# Altium schematic symbol library Electronic Devices_LIB.SchLib: 703 symbols (part 8 of 8)
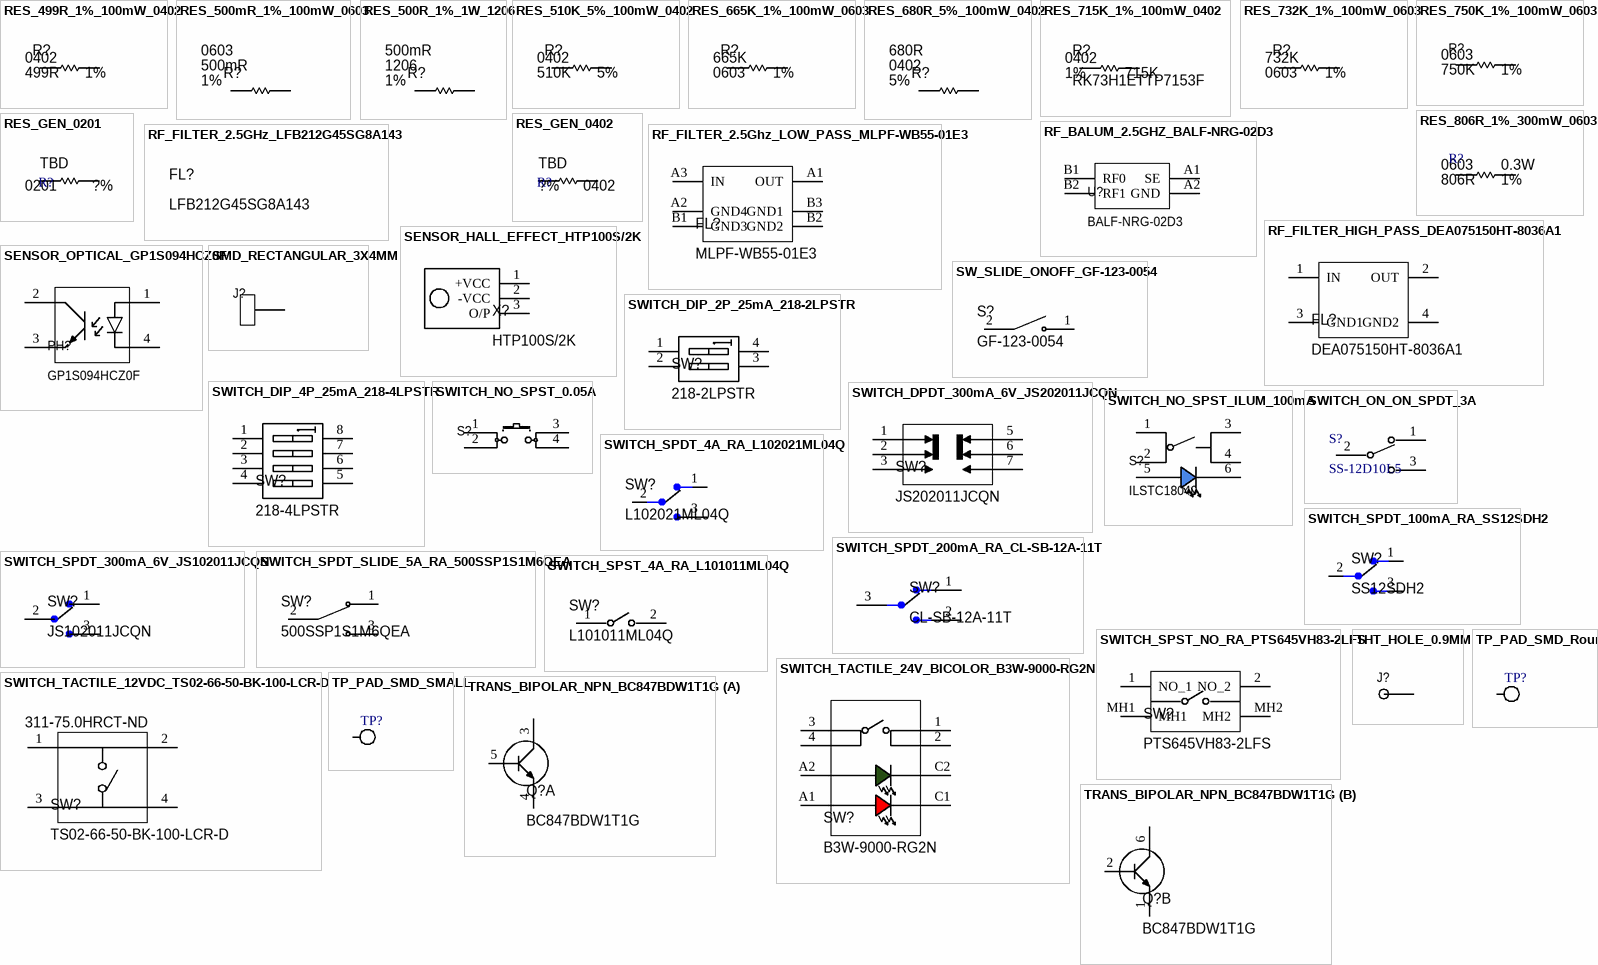
[diagram p43: symbols RES_499R_1%_100mW_0402 to TRANS_BIPOLAR_NPN_BC847BDW1T1G]

## RF_BALUM_2.5GHZ_BALF-NRG-02D3
designator U?, comment BALF-NRG-02D3
50 ohm nominal input / conjugate match to BlueNRG tranceiver, with integrated harmonic filter; Manufacturer: STMicroelectronics; Supplier 1: Digi-Key; Manufacturer Part Number: BALF-NRG-02D3; RoHS: Yes; Category: EMI / RFI Components; Stock 1: 10367; Pricing 1: 1=0.53, 10=0.517, 25=0.3464, 50=0.3082, 100=0.2824, 250=0.2534, 500=0.2481, 1000=0.17948 (USD); Mount: Surface Mount; Packaging: Cut Tape; Series: -; RoHS Compliant: Yes; ComponentLink1URL: http://www.farnell.com/datasheets/2342732.pdf?src-supplier=Farnell; ComponentLink1Description: http://www.farnell.com/datasheets/2342732.pdf?src-supplier=Farnell; ComponentLink2URL: http://www.st.com/content/ccc/resource/technical/document/datasheet/group3/51/4f/c4/19/79/13/4a/ad/DM00408204/files/DM00408204.pdf/jcr:content/translations/en.DM00408204.pdf?src-supplier=Digi-Key; ComponentLink2Description: http://www.st.com/content/ccc/resource/technical/document/datasheet/group3/51/4f/c4/19/79/13/4a/ad/DM00408204/files/DM00408204.pdf/jcr:content/translations/en.DM00408204.pdf?src-supplier=Digi-Key; ComponentLink3URL: http://www.farnell.com/datasheets/2342732.pdf?src-supplier=Element14; ComponentLink3Description: http://www.farnell.com/datasheets/2342732.pdf?src-supplier=Element14; ComponentLink4URL: https://datasheet.octopart.com/BALF-NRG-02D3-STMicroelectronics-datasheet-93404502.pdf?src-supplier=Newark; ComponentLink4Description: https://datasheet.octopart.com/BALF-NRG-02D3-STMicroelectronics-datasheet-93404502.pdf?src-supplier=Newark; ComponentLink5URL: http://www.farnell.com/datasheets/2342732.pdf?src-supplier=Newark; ComponentLink5Description: http://www.farnell.com/datasheets/2342732.pdf?src-supplier=Newark; Supplier Part Number 1: 497-17591-1-ND
footprint RF_BALUN_BALFNRG02D3 (4-UFBGA, CSPBGA)
pins: A1 SE, A2 GND, B1 RF0, B2 RF1

## RF_FILTER_2.5GHz_LFB212G45SG8A143
designator FL?, comment LFB212G45SG8A143
RF Filter Band Pass 2450MHz Frequency 50MHz 2.9dB 50Ohm SMD 4Pin 0805 Embossed T/R; Manufacturer: Murata; Impedance: 50R; Frequency: 2.45GHz; Supplier 1: Digikey; Manufacturer Part Number: LFB212G45SG8A143; RoHS: Yes; Category: EMI / RFI Components; Pricing 1: 4000=0.10415 (USD); Number of Pins: 4; Min Operating Temperature: -40°C; Max Operating Temperature: 85°C; Package Quantity: 4000; Packaging: Tape and Reel; Resistance: 50R; Series: LFB; Length: 2mm; Width: 1.25mm; Radiation Hardening: No; RoHS Compliant: Yes; ComponentLink1URL: http://www.mouser.com/ds/2/281/k99e_l0270-1112974.pdf?src-supplier=Mouser; ComponentLink1Description: http://www.mouser.com/ds/2/281/k99e_l0270-1112974.pdf?src-supplier=Mouser; ComponentLink2URL: http://search.murata.co.jp/Ceramy/CatalogAction.do?sHinnm=?&nbsp&sNHinnm=LFB212G45SG8A143&sNhin_key=LFB212G45SG8A143&sLang=en&sParam=series+U0060L0270S0260A051&src-supplier=Avnet; ComponentLink2Description: http://search.murata.co.jp/Ceramy/CatalogAction.do?sHinnm=?&nbsp&sNHinnm=LFB212G45SG8A143&sNhin_key=LFB212G45SG8A143&sLang=en&sParam=series+U0060L0270S0260A051&src-supplier=Avnet; Supplier Part Number 1: LFB212G45SG8A143-ND

## RF_FILTER_2.5Ghz_LOW_PASS_MLPF-WB55-01E3
designator FL?, comment MLPF-WB55-01E3
Rf Filter, 2.4Ghz To 2.5Ghz, Wlcsp-6 Rohs Compliant: Yes |Stmicroelectronics MLPF-WB55-01E3; Frequency: 2.45GHz; Bandwidth: 100MHz; Insertion Loss: 1.1dB; Supplier 1: Digi-Key; Manufacturer: STMicroelectronics; Manufacturer Part Number: MLPF-WB55-01E3; RoHS: Yes; Category: EMI / RFI Components; Stock 1: 23961; Pricing 1: 1=0.4, 10=0.38, 25=0.368, 50=0.3558, 100=0.3373, 250=0.28212, 500=0.21896, 1000=0.20853 (USD); Mount: Surface Mount; Case/Package: SMD/SMT; Series: -; Packaging: Cut Tape; ComponentLink1URL: http://www.farnell.com/datasheets/2802556.pdf?src-supplier=Farnell; ComponentLink1Description: http://www.farnell.com/datasheets/2802556.pdf?src-supplier=Farnell; ComponentLink2URL: http://www.farnell.com/datasheets/2802556.pdf?src-supplier=Newark; ComponentLink2Description: http://www.farnell.com/datasheets/2802556.pdf?src-supplier=Newark; Supplier Part Number 1: 497-19088-1-ND
footprint RF_FILTER_STMicroelectronics_0_MFG (CSP package)
pins: A1 OUT, A2 GND4 (power), A3 IN (power), B1 GND3 (power), B2 GND2 (power), B3 GND1 (power)

## RF_FILTER_HIGH_PASS_DEA075150HT-8036A1
designator FL?, comment DEA075150HT-8036A1
RF Filter High Pass 5150MHz 2400MHz to 2500MHz 0.5dB 50Ohm SMD 4Pin 0202 T/R; Manufacturer: TDK; Frequency: 5GHz; Supplier 1: Digikey; Manufacturer Part Number: DEA075150HT-8036A1; RoHS: No; Stock 1: 5961; Pricing 1: 1=0.24, 10=0.23, 25=0.2228, 50=0.2154, 100=0.2042, 250=0.1708, 500=0.13256, 1000=0.12625, 5000=0.11139 (USD); Mount: Surface Mount; Case Code (Imperial): 0202; Case Code (Metric): 0505; Packaging: Cut Tape; Insertion Loss: 0.5dB; Series: DEA; ComponentLink1URL: https://media.digikey.com/pdf/Data%20Sheets/TDK%20PDFs/DEA075150HT-8036A1_Rev1.0.pdf?src-supplier=Digikey; ComponentLink1Description: https://media.digikey.com/pdf/Data%20Sheets/TDK%20PDFs/DEA075150HT-8036A1_Rev1.0.pdf?src-supplier=Digikey; Supplier Part Number 1: 445-175384-1-ND
footprint RF_FILTER_HP_DEA075150HT8036A1
pins: 1 IN, 2 OUT, 3 GND1, 4 GND2

## SENSOR_HALL_EFFECT_HTP100S/2K
designator X?, comment HTP100S/2K
The HTP100/2K is a closed loop Hall Effect Current Transformer suitable for measuring currents up to 100A; Manufacturer: Telcom; Manufacturer Part Number: HTP100S/2K
footprint SENSOR_HALL_EFFECT_HTP100S/2K
pins: 1 +VCC, 2 -VCC, 3 O/P

## SENSOR_OPTICAL_GP1S094HCZ0F
designator PH?, comment GP1S094HCZ0F
Photointerrupter Transmissive 3mm Phototransistor 4-Pin SubMiniature Wide-gap; Manufacturer: Sharp; Reverse Breakdown Voltage: 6V; Forward Current: 50mA; Rise Time: 150000ns; Number of Channels: 1; Forward Voltage: 1.2V; Sensing Distance: 0.118inch; Max Collector Current: 20mA; Collector Emitter Voltage (VCEO): 35V; Response Time: 50us; Power Dissipation: 100mW; Supplier 1: Mouser; Manufacturer Part Number: GP1S094HCZ0F; RoHS: Yes; Category: Optical Sensors; Stock 1: 25133; Pricing 1: 1=0.76, 10=0.485, 50=0.485, 100=0.413, 500=0.359, 1000=0.314, 2500=0.307, 5000=0.278, 10000=0.266, 25000=0.263 (USD); Mount: Through Hole; Number of Pins: 4; Contact Plating: Copper,Tin; Min Operating Temperature: -25°C; Max Operating Temperature: 85°C; Packaging: Rail/Tube; Package Quantity: 5000; Fall Time: 150000ns; Number of Elements: 1; Reverse Voltage (DC): 6V; Collector Emitter Breakdown Voltage: 35V; Input Current: 20mA; Output Current: 20mA; Output Configuration: Phototransistor; Collector-emitter Voltage-Max: 35V; Output Voltage: 35V; Max Power Dissipation: 100mW; Output Type: Phototransistor; Series: -; Length: 5.5mm; Width: 2.6mm; Height: 4.8mm; Radiation Hardening: No; Lead Free: Lead Free; RoHS Compliant: Yes; Reach SVHC Compliant: Unknown; ComponentLink1URL: https://datasheet.ciiva.com/11772/0900766b80d1bdb9-11772555.pdf?src-supplier=Rs; ComponentLink1Description: https://datasheet.ciiva.com/11772/0900766b80d1bdb9-11772555.pdf?src-supplier=Rs; ComponentLink2URL: https://datasheet.ciiva.com/4423/gp1s094hcz0f-ds-181193-4423979.pdf?src-supplier=Mouser; ComponentLink2Description: https://datasheet.ciiva.com/4423/gp1s094hcz0f-ds-181193-4423979.pdf?src-supplier=Mouser; ComponentLink3URL: https://datasheet.ciiva.com/2822/gp1s094hcz0f-ds-2822986.pdf?src-supplier=Digi-Key; ComponentLink3Description: https://datasheet.ciiva.com/2822/gp1s094hcz0f-ds-2822986.pdf?src-supplier=Digi-Key; ComponentLink4URL: https://datasheet.ciiva.com/26812/getdatasheetpartid-172569-26812270.pdf?src-supplier=Verical; ComponentLink4Description: https://datasheet.ciiva.com/26812/getdatasheetpartid-172569-26812270.pdf?src-supplier=Verical; ComponentLink5URL: https://datasheet.ciiva.com/16392/gp1s094hcz-e-16392162.pdf?src-supplier=Future+Electronics; ComponentLink5Description: https://datasheet.ciiva.com/16392/gp1s094hcz-e-16392162.pdf?src-supplier=Future+Electronics; ComponentLink6URL: https://datasheet.ciiva.com/7663/gp1s094hcz-e-7663226.pdf?src-supplier=Element14; ComponentLink6Description: https://datasheet.ciiva.com/7663/gp1s094hcz-e-7663226.pdf?src-supplier=Element14; Supplier Part Number 1: 852-GP1S094HCZ0F
footprint SENSOR_OPTICAL_GP1S094HCZ0F (Through Hole, 4.55 pitch)
pins: 1 ANODE, 2 COLLECTOR, 3 EMITTER, 4 CATHODE

## SMD_RECTANGULAR_3X4MM
designator J?, comment SMD_RECTANGULAR_2X3MM  (value not drawn)
Rectangular Pad 2x3mm to connect wires on PCB
footprint SMD_RECTANGULAR (3X4 MM PAD RECTANGULAR)
pins: 1

## SW_SLIDE_ONOFF_GF-123-0054
designator S?, comment GF-123-0054
Slide Switch, Mini, G Series, SPST, ON-OFF, Top Actuated, 0.5A, 125VDC, 8.5A, 125V, PC; Manufacturer: CW Industries; Mechanical Life: 10000Cycles; Actuator Material: Nylon,Polyamide,PA66; Electrical Life: 6000Cycles; Switch Travel: 3.61mm; Actuator Type: Standard; Actuator Length: 5.08mm; Supplier 1: Digikey; Manufacturer Part Number: GF-123-0054; RoHS: Yes; Category: Slide Switches; Stock 1: 1504; Pricing 1: 1=1.5, 10=1.439, 500=0.9902, 1000=0.92112, 5000=0.7772, 10000=0.71963 (USD); Mount: Through Hole; Contact Material: Copper; Contact Plating: Silver; Min Operating Temperature: -10°C; Max Operating Temperature: 104°C; Package Quantity: 500; Packaging: Bulk; Voltage Rating (AC): 125V; Voltage Rating (DC): 125V; Termination: PC Pin; Throw Configuration: SPST; Switch Function: On-Off; Series: GF; RoHS Compliant: Yes; ComponentLink1URL: https://datasheet.ciiva.com/25648/gf-123-dimension-drawing-25648859.pdf?src-supplier=Digikey; ComponentLink1Description: https://datasheet.ciiva.com/25648/gf-123-dimension-drawing-25648859.pdf?src-supplier=Digikey; ComponentLink2URL: https://datasheet.ciiva.com/18517/gfxx23andxx24-18517237.pdf?src-supplier=Digikey; ComponentLink2Description: https://datasheet.ciiva.com/18517/gfxx23andxx24-18517237.pdf?src-supplier=Digikey; Supplier Part Number 1: CWI333-ND
footprint SW_SLIDE_GF-123-0054 (3.61mm)
pins: 1, 2

## SWITCH_DIP_2P_25mA_218-2LPSTR
designator SW?, comment 218-2LPSTR
Switch DIP ON OFF SPST 2 Recessed Slide 0.025A 24VDC Gull Wing 1000Cycles 1.27mm SMD T/R; Manufacturer: CTS; Voltage Rating (DC): 24V; Current Rating: 25mA; Number of Positions: 2; Actuator Type: Slide (Standard); Pitch: 0.05inch; Washable: Yes; Supplier 1: Digi-Key; Manufacturer Part Number: 218-2LPSTR; RoHS: Yes; Category: DIP Switches; Stock 1: 31125; Pricing 1: 1=0.97, 10=0.93, 25=0.8692, 100=0.7548, 250=0.6868, 500=0.6367, 1000=0.59021 (USD); Mount: Surface Mount; Contact Material: Copper; Contact Plating: Gold; Min Operating Temperature: -55°C; Max Operating Temperature: 85°C; Packaging: Tape and Reel; Throw Configuration: SPST; Termination: Gull Wing; Electrical Life: 1000Cycles; Series: 218; Package Quantity: 2000; Max Current Rating: 25mA; Orientation: Straight; Length: 0.146inch; Depth: 8.44mm; Radiation Hardening: No; Lead Free: Lead Free; RoHS Compliant: Yes; ComponentLink1URL: https://datasheet.ciiva.com/2865/218-2865152.pdf?src-supplier=Digi-Key; ComponentLink1Description: https://datasheet.ciiva.com/2865/218-2865152.pdf?src-supplier=Digi-Key; ComponentLink2URL: https://datasheet.ciiva.com/29890/218-29890939.pdf?src-supplier=Avnet; ComponentLink2Description: https://datasheet.ciiva.com/29890/218-29890939.pdf?src-supplier=Avnet; ComponentLink3URL: https://datasheet.ciiva.com/15184/getdatasheetpartid-224320-15184939.pdf?src-supplier=Verical; ComponentLink3Description: https://datasheet.ciiva.com/15184/getdatasheetpartid-224320-15184939.pdf?src-supplier=Verical; Supplier Part Number 1: CT3108CT-ND
footprint SW_DIP_2P_2182LPSTR (0.050" (1.27mm), Half)
pins: 1 A1, 2 A2, 3 B2, 4 B1

## SWITCH_DIP_4P_25mA_218-4LPSTR
designator SW?, comment 218-4LPSTR
Switch DIP ON OFF SPST 4 Recessed Slide 0.025A 24VDC Gull Wing 1000Cycles 1.27mm SMD T/R; Manufacturer: CTS; Number of Positions: 4; Voltage Rating (DC): 24V; Actuator Type: Slide (Standard); Max Current Rating: 25mA; Washable: Yes; Supplier 1: Digi-Key; Manufacturer Part Number: 218-4LPSTR; RoHS: Yes; Category: DIP Switches; Stock 1: 12605; Pricing 1: 1=1.08, 10=1.041, 25=0.978, 100=0.8449, 250=0.76996, 500=0.71586, 1000=0.66592 (USD); Mount: Surface Mount; Contact Material: Copper; Contact Plating: Gold; Mechanical Life: 1000Cycles; Min Operating Temperature: -55°C; Max Operating Temperature: 85°C; Throw Configuration: SPST; Packaging: Tape and Reel; Electrical Life: 1000Cycles; Series: 218; Max Voltage Rating (DC): 24V; Termination: Gull Wing; Orientation: Straight; Package Quantity: 2000; Length: 6.25mm; Depth: 8.44mm; Radiation Hardening: No; Lead Free: Lead Free; RoHS Compliant: Yes; ComponentLink1URL: https://datasheet.ciiva.com/8676/218-8676896.pdf?src-supplier=Avnet; ComponentLink1Description: https://datasheet.ciiva.com/8676/218-8676896.pdf?src-supplier=Avnet; ComponentLink2URL: https://datasheet.ciiva.com/8082/218-8082342.pdf?src-supplier=Avnet; ComponentLink2Description: https://datasheet.ciiva.com/8082/218-8082342.pdf?src-supplier=Avnet; ComponentLink3URL: https://datasheet.ciiva.com/16303/218-16303941.pdf?src-supplier=Future+Electronics; ComponentLink3Description: https://datasheet.ciiva.com/16303/218-16303941.pdf?src-supplier=Future+Electronics; ComponentLink4URL: https://datasheet.ciiva.com/15184/getdatasheetpartid-141001-15184860.pdf?src-supplier=Verical; ComponentLink4Description: https://datasheet.ciiva.com/15184/getdatasheetpartid-141001-15184860.pdf?src-supplier=Verical; Supplier Part Number 1: CT3110CT-ND
footprint SW_DIP_SOIC127P844X265-8N (0.050" (1.27mm), Half)
pins: 1 A1, 2 A2, 3 A3, 4 A4, 5 B4, 6 B3, 7 B2, 8 B1

## SWITCH_DPDT_300mA_6V_JS202011JCQN
designator SW?, comment JS202011JCQN
SWITCH SLIDE DPDT 300mA 6V; Manufacturer: ITT C&K; Actuator Material: Nylon,Polyamide,PA46; Switch Function: On-On; Actuator Type: Standard; Switch Travel: 2mm; Electrical Life: 5000Cycles; Supplier 1: Digikey; Manufacturer Part Number: JS202011JCQN; RoHS: No; Category: Slide Switches; Stock 1: 20641; Pricing 1: 1=0.8, 10=0.769, 25=0.74, 100=0.6422, 250=0.58596, 500=0.54452 (USD); Mount: Surface Mount; Contact Material: Copper Alloy; Contact Plating: Silver; Min Operating Temperature: -40°C; Max Operating Temperature: 85°C; Throw Configuration: DPDT; Packaging: Cut Tape; Voltage Rating (DC): 6V; Series: JS; Actuator Length: 2mm; ComponentLink1URL: http://www.farnell.com/datasheets/2674788.pdf?src-supplier=Farnell; ComponentLink1Description: http://www.farnell.com/datasheets/2674788.pdf?src-supplier=Farnell; ComponentLink2URL: http://www.farnell.com/datasheets/2674788.pdf?src-supplier=Element14; ComponentLink2Description: http://www.farnell.com/datasheets/2674788.pdf?src-supplier=Element14; ComponentLink3URL: https://datasheet.octopart.com/JS202011JCQN-C%26K-Components-datasheet-67873653.pdf?src-supplier=Newark; ComponentLink3Description: https://datasheet.octopart.com/JS202011JCQN-C%26K-Components-datasheet-67873653.pdf?src-supplier=Newark; ComponentLink4URL: http://www.farnell.com/datasheets/2674788.pdf?src-supplier=Newark; ComponentLink4Description: http://www.farnell.com/datasheets/2674788.pdf?src-supplier=Newark; ComponentLink5URL: https://www.ckswitches.com/media/1422/js.pdf?src-supplier=Digikey; ComponentLink5Description: https://www.ckswitches.com/media/1422/js.pdf?src-supplier=Digikey; ComponentLink6URL: https://datasheet.octopart.com/JS202011JCQN-C%26K-Components-datasheet-138126065.pdf?src-supplier=TME; ComponentLink6Description: https://datasheet.octopart.com/JS202011JCQN-C%26K-Components-datasheet-138126065.pdf?src-supplier=TME; Supplier Part Number 1: CKN10723DKR-ND
footprint SW_JS202011JCQN
pins: 1, 2, 3, 5, 6, 7

## SWITCH_NO_SPST_0.05A
designator S?, comment PTS526SK15SMTR2LFS  (value not drawn)
Switch Tactile N.O. SPST Round Button Gull Wing 0.05A 12VDC 200000Cycles 2.55N SMD T/R; Manufacturer: ITT C&K; Supplier 1: Digi-Key; Manufacturer Part Number: PTS526SK15SMTR2LFS; RoHS: No; Category: Uncategorized; Stock 1: 382158; Pricing 1: 1=0.12, 10=0.12, 25=0.114, 100=0.1035, 250=0.09732, 500=0.08904, 1000=0.07454 (USD); Supplier Part Number 1: CKN12221-6-ND
footprint SWT_NO_PTS526SK15SMTR2LFS (TACT 5.2 X 5.2 mm)
pins: 1 COM_1, 2 COM2, 3 NO1, 4 NO2

## SWITCH_NO_SPST_ILUM_100mA
designator S?, comment ILSTC18040
Switch Tactile SPST N.O. 100mA 30V 100000Cycle Blue 6-Pin Through Hole Bulk; Manufacturer: ITT C&K; Mechanical Life: 100000Cycles; Illumination Type: Illuminated,LED; Switch Function: Off-Mom; Operating Force: 180gf; Switch Travel: 0.25mm; Supplier 1: Newark; Manufacturer Part Number: ILSTC18040; RoHS: No; Stock 1: 999; Pricing 1: 1=0.19, 10=0.19, 25=0.19, 50=0.19, 100=0.19, 250=0.19 (USD); Mount: Through Hole; Min Operating Temperature: -40°C; Max Operating Temperature: 85°C; Throw Configuration: SPST; Series: ILS; Termination: PC Pin; ComponentLink1URL: https://www.ckswitches.com/media/2865/ils.pdf?src-supplier=Digi-Key; ComponentLink1Description: https://www.ckswitches.com/media/2865/ils.pdf?src-supplier=Digi-Key; Supplier Part Number 1: 52AH1809
footprint SWT_LED_SPST_NO (Tactile Switches 180gf, Blue LED 7.2x6.8x7.0mm, THT)
pins: 1, 2, 3, 4, 5 A, 6 C

## SWITCH_ON_ON_SPDT_3A
designator S?, comment SS-12D10L5
3A Straight SPDT 125V 125V 3A 10000次 Black Plugin Slide Switches ROHS; Manufacturer: XKB Connectivity; Switch Function: ON/ON; Supplier: LCSC; Manufacturer Part Number: SS-12D10L5; RoHS: yes; Orientation: Vertical; Current Rating: 3A; Voltage Rating (AC): 125V; Mounting Style: Straight; ComponentLink1Description: Supplier; ComponentLink1URL: https://www.lcsc.com/product-detail/Slide-Switches_XKB-Connectivity-SS-12D10L5_C319012.html?utm_source=octopart&utm_medium=cpc&utm_campaign=SS-12D10L5
footprint SWT_SS12D10L5 (13mm x 6.8mm, pitch 4.7mm)
pins: 1, 2 2(COM), 3

## SWITCH_SPDT_4A_RA_L102021ML04Q
designator SW?, comment L102021ML04Q
Switch Slide SPDT Extended Side Slide 4A 250VAC 125VDC PC Pins Thru-Hole; Manufacturer: ITT C&K; Actuator Material: Nylon,Polyamide,PA66; Actuator Color: Black; Body Material: Stainless Steel,Nylon,Epoxy; Voltage Rating (AC): 125V; Voltage Rating (DC): 28V; Max Voltage Rating (AC): 250V; Electrical Life: 10000Cycles; Switch Travel: 3.56mm; Switch Function: On-On; Actuator Type: Standard; Number of Poles: 1; Number of Positions: 2; Actuator Length: 8.51mm; Approvals: UL; Supplier 1: Arrow Electronics; Manufacturer Part Number: L102021ML04Q; RoHS: Yes; Category: Slide Switches; Stock 1: 308; Pricing 1: 1=1.6905, 10=1.6255, 50=1.5284, 100=1.499, 250=1.484, 500=1.4691, 1000=1.4365, 2500=1.4062, 5000=1.3889 (USD); Mount: Through Hole,PCB; Housing Material: Nylon; Contact Material: Copper,Silver; Contact Plating: Silver; Min Operating Temperature: -30°C; Max Operating Temperature: 65°C; Max Current Rating: 4A; Throw Configuration: SPDT; Max Voltage Rating (DC): 125V; Packaging: Bulk; Termination: PC Pins; Orientation: Right Angle; Series: L; Contact Current Rating: 4A; Current Rating: 4A; Length: 19.3mm; Depth: 20.45mm; RoHS Compliant: Yes; Flammability Rating: UL94 V-2; Lead Free: Lead Free; ComponentLink1URL: https://datasheet.ciiva.com/16290/l102021ml04q-16290324.pdf?src-supplier=Future+Electronics; ComponentLink1Description: https://datasheet.ciiva.com/16290/l102021ml04q-16290324.pdf?src-supplier=Future+Electronics; ComponentLink2URL: https://datasheet.ciiva.com/8627/l-10jun14-8627375.pdf?src-supplier=Avnet; ComponentLink2Description: https://datasheet.ciiva.com/8627/l-10jun14-8627375.pdf?src-supplier=Avnet; ComponentLink3URL: https://datasheet.ciiva.com/2889/l-10jun14-2889244.pdf?src-supplier=Digikey; ComponentLink3Description: https://datasheet.ciiva.com/2889/l-10jun14-2889244.pdf?src-supplier=Digikey; Supplier Part Number 1: L102021ML04Q
footprint SW_L102021ML04Q
pins: 1, 2, 3

## SWITCH_SPDT_100mA_RA_SS12SDH2
designator SW?, comment SS12SDH2
Switch Slide ON None ON SPDT Side Slide 0.1A 30VDC 10000Cycles PC Pins Thru-Hole; Manufacturer: NKK Switches; Actuator Material: Nylon,Polyamide; Voltage Rating (DC): 30V; Contact Current Rating: 100mA; Voltage Rating (AC): 28V; Illumination Type: Non-Illuminated; Switch Travel: 2mm; Switch Function: On-On; Insulation Resistance: 100MR; Actuator Type: Standard; Number of Positions: 2; Actuator Length: 2.5mm; Supplier 1: Digikey; Manufacturer Part Number: SS12SDH2; RoHS: Yes; Category: Slide Switches; Stock 1: 1253; Pricing 1: 1=1.87, 10=1.816, 25=1.6516, 80=1.435, 230=1.30048, 440=1.2108, 945=1.1211, 2400=1.01646, 4900=0.94172 (USD); Mount: Through Hole; Contact Material: Bronze,Brass,Silver; Contact Plating: Silver; Mechanical Life: 10000Cycles; Housing Material: Resin; Min Operating Temperature: -15°C; Max Operating Temperature: 60°C; Throw Configuration: SPDT; Packaging: Tray; Termination: PC Pin; Electrical Life: 10000Cycles; Series: SS; Max Current Rating: 100mA; Max Voltage Rating (DC): 30V; Orientation: Horizontal; Length: 10.2mm; Depth: 6.5mm; Lead Free: Lead Free; Flammability Rating: UL94 V-0; RoHS Compliant: Yes; Reach SVHC Compliant: No; ComponentLink1URL: https://datasheet.ciiva.com/16984/70192900-16984988.pdf?src-supplier=Allied+Electronics; ComponentLink1Description: https://datasheet.ciiva.com/16984/70192900-16984988.pdf?src-supplier=Allied+Electronics; ComponentLink2URL: https://datasheet.ciiva.com/16377/ssnonilluminated-16377176.pdf?src-supplier=Future+Electronics; ComponentLink2Description: https://datasheet.ciiva.com/16377/ssnonilluminated-16377176.pdf?src-supplier=Future+Electronics; Supplier Part Number 1: 360-2134-ND
footprint SW_SS12SDH2
pins: 1 NC, 2 COM, 3 NO

## SWITCH_SPDT_200mA_RA_CL-SB-12A-11T
designator SW?, comment CL-SB-12A-11T
Switch Slide ON-ON SPDT Side 200mA 12VDC 10000Cycles J-Lead T/R; Manufacturer: Nidec Copal; Actuator Material: Nylon,Polyamide; Voltage Rating (DC): 12V; Switch Travel: 2mm; Actuator Type: Standard; Operating Force: 153gf; Supplier 1: Digikey; Manufacturer Part Number: CL-SB-12A-11T; RoHS: Yes; Category: Slide Switches; Stock 1: 42741; Pricing 1: 1=0.89, 10=0.852, 25=0.8008, 100=0.6918, 250=0.63048 (USD); Mount: Surface Mount; Case/Package: SMD/SMT; Contact Material: Copper; Contact Plating: Silver; Min Operating Temperature: -40°C; Max Operating Temperature: 85°C; Packaging: Cut Tape; Electrical Life: 10000Cycles; Throw Configuration: SPDT; Switch Function: On-On; Series: CL-SB; Actuator Length: 2mm; RoHS Compliant: Yes; ComponentLink1URL: https://datasheet.ciiva.com/6462/cl-sb-6462040.pdf?src-supplier=Digikey; ComponentLink1Description: https://datasheet.ciiva.com/6462/cl-sb-6462040.pdf?src-supplier=Digikey; ComponentLink2URL: https://datasheet.ciiva.com/6462/cl-sb-6462042.pdf?src-supplier=Digikey; ComponentLink2Description: https://datasheet.ciiva.com/6462/cl-sb-6462042.pdf?src-supplier=Digikey; ComponentLink3URL: https://datasheet.ciiva.com/6462/cl-sb-6462044.pdf?src-supplier=Digikey; ComponentLink3Description: https://datasheet.ciiva.com/6462/cl-sb-6462044.pdf?src-supplier=Digikey; Supplier Part Number 1: 563-1316-1-ND
footprint SW_CLSB12A11T
pins: 1, 2, 3

## SWITCH_SPDT_300mA_6V_JS102011JCQN
designator SW?, comment JS102011JCQN
SWITCH SLIDE SPDT 300MA 6V; Manufacturer: ITT C&K; Actuator Material: Nylon,Polyamide,PA46; Switch Function: On-On; Actuator Type: Standard; Switch Travel: 2mm; Electrical Life: 5000Cycles; Supplier 1: Digikey; Manufacturer Part Number: JS102011JCQN; RoHS: Yes; Category: Slide Switches; Stock 1: 40877; Pricing 1: 1=0.94, 10=0.903, 25=0.8444, 100=0.7331, 250=0.66708, 500=0.61844 (USD); Mount: Surface Mount; Contact Material: Copper Alloy; Contact Plating: Silver; Min Operating Temperature: -40°C; Max Operating Temperature: 85°C; Throw Configuration: SPDT; Packaging: Cut Tape; Voltage Rating (DC): 6V; Series: JS; Actuator Length: 2mm; ComponentLink1URL: http://www.farnell.com/datasheets/2674788.pdf?src-supplier=Farnell; ComponentLink1Description: http://www.farnell.com/datasheets/2674788.pdf?src-supplier=Farnell; ComponentLink2URL: http://www.farnell.com/datasheets/2674788.pdf?src-supplier=Element14; ComponentLink2Description: http://www.farnell.com/datasheets/2674788.pdf?src-supplier=Element14; ComponentLink3URL: https://datasheet.octopart.com/JS102011JCQN-C%26K-Components-datasheet-67873653.pdf?src-supplier=Newark; ComponentLink3Description: https://datasheet.octopart.com/JS102011JCQN-C%26K-Components-datasheet-67873653.pdf?src-supplier=Newark; ComponentLink4URL: http://www.farnell.com/datasheets/2674788.pdf?src-supplier=Newark; ComponentLink4Description: http://www.farnell.com/datasheets/2674788.pdf?src-supplier=Newark; ComponentLink5URL: https://www.ckswitches.com/media/1422/js.pdf?src-supplier=Digikey; ComponentLink5Description: https://www.ckswitches.com/media/1422/js.pdf?src-supplier=Digikey; ComponentLink6URL: https://datasheet.octopart.com/JS102011JCQN-C%26K-Components-datasheet-138126065.pdf?src-supplier=TME; ComponentLink6Description: https://datasheet.octopart.com/JS102011JCQN-C%26K-Components-datasheet-138126065.pdf?src-supplier=TME; Supplier Part Number 1: CKN10721CT-ND
footprint SW_JS102011JCQN (2.00mm)
pins: 1, 2, 3

## SWITCH_SPDT_SLIDE_5A_RA_500SSP1S1M6QEA
designator SW?, comment 500SSP1S1M6QEA
Switch Slide ON None ON SPDT Side Slide 5A 250VAC 28VDC PC Pins Bracket Mount/Through Hole; Manufacturer: E-Switch; Mechanical Life: 30000Cycles; Actuator Material: Nylon,Polyamide; Voltage Rating (AC): 120V; Voltage Rating (DC): 28V; Switch Travel: 2.16mm; Switch Function: On-On; Actuator Type: Standard; Max Voltage Rating (AC): 250V; Contact Resistance: 10mR; Number of Positions: 2; Actuator Length: 4.72mm; Supplier 1: Digikey; Manufacturer Part Number: 500SSP1S1M6QEA; RoHS: Yes; Category: Slide Switches; Stock 1: 5142; Pricing 1: 1=3.45, 10=3.306, 54=2.80259, 108=2.61574, 270=2.37144, 540=2.19896, 1026=2.04087, 2538=1.85403, 5022=1.77875 (USD); Mount: Through Hole,Brackets; Contact Plating: Silver; Contact Material: Copper Alloy,Copper,Silver; Housing Material: Stainless Steel; Min Operating Temperature: -30°C; Max Operating Temperature: 85°C; Throw Configuration: SPDT; Packaging: Bulk; Termination: PC Pin; Electrical Life: 30000Cycles; Orientation: Right Angle; Series: 500; Contact Current Rating: 5A; Max Voltage Rating (DC): 28V; RoHS Compliant: Yes; Lead Free: Lead Free; Reach SVHC Compliant: Unknown; Flammability Rating: UL94 V-0; ComponentLink1URL: https://datasheet.ciiva.com/2889/t511006d-2889419.pdf?src-supplier=Digikey; ComponentLink1Description: https://datasheet.ciiva.com/2889/t511006d-2889419.pdf?src-supplier=Digikey; ComponentLink2URL: https://datasheet.ciiva.com/16174/35500-16174234.pdf?src-supplier=Onlinecomponents.com; ComponentLink2Description: https://datasheet.ciiva.com/16174/35500-16174234.pdf?src-supplier=Onlinecomponents.com; ComponentLink3URL: https://datasheet.ciiva.com/16337/500-16337624.pdf?src-supplier=Future+Electronics; ComponentLink3Description: https://datasheet.ciiva.com/16337/500-16337624.pdf?src-supplier=Future+Electronics; Supplier Part Number 1: EG2478-ND
footprint SW_500SSP1S1M6QEA
pins: 1 NC, 2 COM, 3 NO

## SWITCH_SPST_4A_RA_L101011ML04Q
designator SW?, comment L101011ML04Q
Switch Slide ON OFF SPST Side Slide 4A 250VAC 125VDC PC Pins Thru-Hole Bulk; Manufacturer: ITT C&K; Actuator Material: Nylon,Polyamide,PA66; Actuator Color: Black; Voltage Rating (AC): 125V; Voltage Rating (DC): 28V; Max Voltage Rating (AC): 250V; Electrical Life: 10000Cycles; Switch Travel: 3.56mm; Switch Function: On-Off; Actuator Type: Standard; Actuator Length: 5.08mm; Supplier 1: Arrow Electronics; Manufacturer Part Number: L101011ML04Q; RoHS: Yes; Category: Slide Switches; Stock 1: 162; Pricing 1: 1=2.077, 10=2.033, 50=1.993, 100=1.858, 250=1.84, 500=1.788, 1000=1.706, 2500=1.674, 5000=1.634 (USD); Mount: Through Hole; Contact Material: Copper; Contact Plating: Silver; Housing Material: Nylon; Min Operating Temperature: -30°C; Max Operating Temperature: 65°C; Package Quantity: 1; Packaging: Bulk; Throw Configuration: SPST; Max Current Rating: 4A; Max Voltage Rating (DC): 125V; Current Rating: 4A; Termination: PC Pins; Orientation: Right Angle; Series: L; Length: 19.3mm; Depth: 17.02mm; Radiation Hardening: No; RoHS Compliant: Yes; ComponentLink1URL: https://datasheet.ciiva.com/12446/l-10jun14-12446678.pdf?src-supplier=Mouser; ComponentLink1Description: https://datasheet.ciiva.com/12446/l-10jun14-12446678.pdf?src-supplier=Mouser; ComponentLink2URL: https://datasheet.ciiva.com/8625/l-10jun14-8625496.pdf?src-supplier=Avnet; ComponentLink2Description: https://datasheet.ciiva.com/8625/l-10jun14-8625496.pdf?src-supplier=Avnet; Supplier Part Number 1: L101011ML04Q
footprint SW_C&K_Switches_L101011ML04Q_MFG
pins: 1, 2

## SWITCH_SPST_NO_RA_PTS645VH83-2LFS
designator SW?, comment PTS645VH83-2LFS
Switch Tactile N.O SPST Round Button PC Pins 0.05A 12VDC 100000Cycle 1.96N Thru-Hole Bulk; Manufacturer: ITT C&K; Mechanical Life: 100000Cycles; Actuator Material: Nylon,Polyamide,PA66; Max Voltage Rating (DC): 12V; Max Current Rating: 50mA; Illumination Type: Non-Illuminated; Switch Function: Off-Mom; Actuator Type: Standard; Supplier 1: Newark; Manufacturer Part Number: PTS645VH83-2LFS; RoHS: Yes; Stock 1: 103123; Pricing 1: 1=0.352 (USD); Mount: Through Hole; Contact Plating: Silver; Contact Material: Bronze; Color: Black; Min Operating Temperature: -20°C; Max Operating Temperature: 60°C; Packaging: Bulk; Operating Force: 1.96N; Throw Configuration: SPST; Termination: PC Pins; Voltage Rating (DC): 12V; Current Rating: 50mA; Package Quantity: 1000; Orientation: Right Angle; Series: PTS645; Length: 7.5mm; Depth: 12.3mm; Radiation Hardening: No; Lead Free: Lead Free; RoHS Compliant: Yes; ComponentLink1URL: https://datasheet.ciiva.com/26930/getdatasheetpartid-759839-26930136.pdf?src-supplier=Verical; ComponentLink1Description: https://datasheet.ciiva.com/26930/getdatasheetpartid-759839-26930136.pdf?src-supplier=Verical; ComponentLink2URL: https://datasheet.ciiva.com/14920/pts645-14920698.pdf?src-supplier=Digikey; ComponentLink2Description: https://datasheet.ciiva.com/14920/pts645-14920698.pdf?src-supplier=Digikey; Supplier Part Number 1: 41AJ9932
footprint SW_RA_PTS645VH832LFS
pins: 1 NO_1, 2 NO_2, MH1, MH2

## SWITCH_TACTILE_12VDC_TS02-66-50-BK-100-LCR-D
designator SW?, comment TS02-66-50-BK-100-LCR-D  Supplier Part Number 2: 311-75.0HRCT-ND
Res Thick Film 0603 75 Ohm 1% 0.1W(1/10W) ±100ppm/C Pad SMD T/R; Manufacturer: CUI Devices; Resistance: 75R; Power Rating: 100mW; Voltage Rating: 50V; Temperature Coefficient: 100ppm/°C; Supplier 1: Digikey; Manufacturer Part Number: TS02-66-50-BK-100-LCR-D; RoHS: No; Category: Tactile Switches; Stock 1: 2726; Pricing 1: 1=0.1, 10=0.097, 25=0.0916, 100=0.0833, 250=0.07832, 500=0.07166, 1000=0.05999, 3000=0.05833, 5000=0.05499 (USD); Supplier Part Number 1: 2223-TS02-66-50-BK-100-LCR-D-ND; Supplier 2: Digikey; Stock 2: 937884; Pricing 2: 1=0.1, 10=0.012, 50=0.0096, 100=0.0071, 500=0.00612, 1000=0.0051 (USD); Case/Package: 0603; Case Code (Metric): 1608; Case Code (Imperial): 0603; Size Code: 0603; Min Operating Temperature: -55°C; Max Operating Temperature: 155°C; Tolerance: 1%; Package Quantity: 1; Packaging: Tape and Reel; Resistor Type: Thick Film; Number of Terminations: 2; Termination: SMD/SMT; Max Power Dissipation: 100mW; Voltage Rating (DC): 50V; Features: Moisture Resistant; Series: RC; Resistance Tolerance: 1%; Construction: Rectangular; Technology: THICK FILM; Length: 0.063inch; Width: 0.031inch; Height: 0.022inch; Depth: 0.8mm; Reach SVHC Compliant: No; Military Standard: Not; Lead Free: Lead Free; RoHS Compliant: Yes; ComponentLink1URL: https://datasheet.ciiva.com/11819/0900766b80f96399-11819407.pdf?src-supplier=Rs; ComponentLink1Description: https://datasheet.ciiva.com/11819/0900766b80f96399-11819407.pdf?src-supplier=Rs; ComponentLink2URL: https://datasheet.ciiva.com/2453/pyu-r-int-thick-7-2453961.pdf?src-supplier=Digikey; ComponentLink2Description: https://datasheet.ciiva.com/2453/pyu-r-int-thick-7-2453961.pdf?src-supplier=Digikey; ComponentLink3URL: https://datasheet.ciiva.com/2453/pyu-r-int-thick-7-2453962.pdf?src-supplier=Digikey; ComponentLink3Description: https://datasheet.ciiva.com/2453/pyu-r-int-thick-7-2453962.pdf?src-supplier=Digikey; ComponentLink4URL: https://datasheet.ciiva.com/2453/pyu-r-int-thick-7-2453963.pdf?src-supplier=Digikey; ComponentLink4Description: https://datasheet.ciiva.com/2453/pyu-r-int-thick-7-2453963.pdf?src-supplier=Digikey; ComponentLink5URL: https://datasheet.ciiva.com/46395/443971-46395018.pdf?src-supplier=Element14; ComponentLink5Description: https://datasheet.ciiva.com/46395/443971-46395018.pdf?src-supplier=Element14
footprint SW_TS02-66-50-BK-100-LCR-D
pins: 1, 2, 3, 4

## SWITCH_TACTILE_24V_BICOLOR_B3W-9000-RG2N
designator SW?, comment B3W-9000-RG2N
Switch Tactile N.O. SPST Square Button PC Pins 0.05A 24VDC 1.57N Thru-Hole Box; Manufacturer: Omron; Mechanical Life: 1000000Cycles; Actuator Color: White; Contact Resistance: 100mR; Voltage Rating (DC): 24V; Illumination Type: LED,Illuminated; Current Rating: 50mA; Illumination Color: Green,Red; Switch Travel: 0.25mm; Switch Function: Off-Mom; Supplier 1: Digikey; Manufacturer Part Number: B3W-9000-RG2N; RoHS: Yes; Category: Tactile Switches; Stock 1: 4120; Pricing 1: 1=2.83, 10=2.803, 25=2.7732, 80=2.55775, 300=2.3995 (USD); Mount: Through Hole; Color: White; Contact Plating: Silver; Contact Material: Silver; Min Operating Temperature: -25°C; Max Operating Temperature: 70°C; Throw Configuration: SPST; Operating Force: 1.57N; Package Quantity: 300; Packaging: Tray; Max Voltage Rating (DC): 24V; Termination: PC Pin; Orientation: Straight; Insulation Resistance: 100MR; Series: B3W-9; RoHS Compliant: Yes; Reach SVHC Compliant: Unknown; ComponentLink1URL: https://datasheet.ciiva.com/1634/35187-1634496.pdf?src-supplier=Farnell; ComponentLink1Description: https://datasheet.ciiva.com/1634/35187-1634496.pdf?src-supplier=Farnell; ComponentLink2URL: https://datasheet.ciiva.com/2900/b3w-9-0114-2900131.pdf?src-supplier=Digikey; ComponentLink2Description: https://datasheet.ciiva.com/2900/b3w-9-0114-2900131.pdf?src-supplier=Digikey; ComponentLink3URL: https://datasheet.ciiva.com/16155/b3w-9-1110-16155083.pdf?src-supplier=Onlinecomponents.com; ComponentLink3Description: https://datasheet.ciiva.com/16155/b3w-9-1110-16155083.pdf?src-supplier=Onlinecomponents.com; ComponentLink4URL: https://datasheet.ciiva.com/1532/35187-1532696.pdf?src-supplier=Element14; ComponentLink4Description: https://datasheet.ciiva.com/1532/35187-1532696.pdf?src-supplier=Element14; ComponentLink5URL: https://datasheet.ciiva.com/14142/b3w9-eng-datasheet-14142472.pdf?src-supplier=Distrelec; ComponentLink5Description: https://datasheet.ciiva.com/14142/b3w9-eng-datasheet-14142472.pdf?src-supplier=Distrelec; Supplier Part Number 1: SW1038-ND
footprint SW_TACTILE_B3W9000RG2N
pins: 1, 2, 3, 4, A1, A2, C1, C2

## THT_HOLE_0.9MM
designator J?, comment THT_HOLE_0.9mm  (value not drawn)
Hole of 0.9mm to soldering wire on PCB
footprint THT_0.9MM (Hole of 0.9mm , 1.8mm AR)
pins: 1

## TP_PAD_SMD_Round
designator TP?, comment NO COMPONENT  (value not drawn)  (no BOM)
Test Point, SMD pad, round, 1.5mm, 1.6mm, 3mm diameter
footprint TP_PAD_1.6MM_SMD_ROUND (Test Point, round, 3mm diameter, smd pad)
footprint TP_PAD_1.5MM_SMD_ROUND (Test Point, round, 1.5mm diameter, smd pad)
footprint TP_PAD_3MM_SMD_ROUND (Test Point, round, 3mm diameter, smd pad)
footprint TP_PAD_0.8MM_SMD_ROUND (Test Point, round, 0.8mm diameter, smd pad)
pins: 1 "Thermal Pad"

## TP_PAD_SMD_SMALL
designator TP?, comment NO COMPONENT  (value not drawn)  (no BOM)
Test Point, SMD pad, round, 1.5mm, 1.6mm, 3mm diameter
footprint TP_PAD_0.5MM_SMD_ROUND (Test Point, round, 0.5mm diameter, smd pad)
pins: 1 "Thermal Pad"

## TRANS_BIPOLAR_NPN_BC847BDW1T1G
designator Q?, comment BC847BDW1T1G